# Altium footprint library MyPcbLib.PcbLib: 87 footprints (part 6 of 6)
Each footprint in its own frame and in the unit in brackets; x right, y up, seen from the top. Pads: shape width x height; smd on the part's side, far side on the other; paste and mask are expansions set on the pad; w line width, h text height; cw(c..) or ccw(c..) is an arc to the next point about the centre after c.
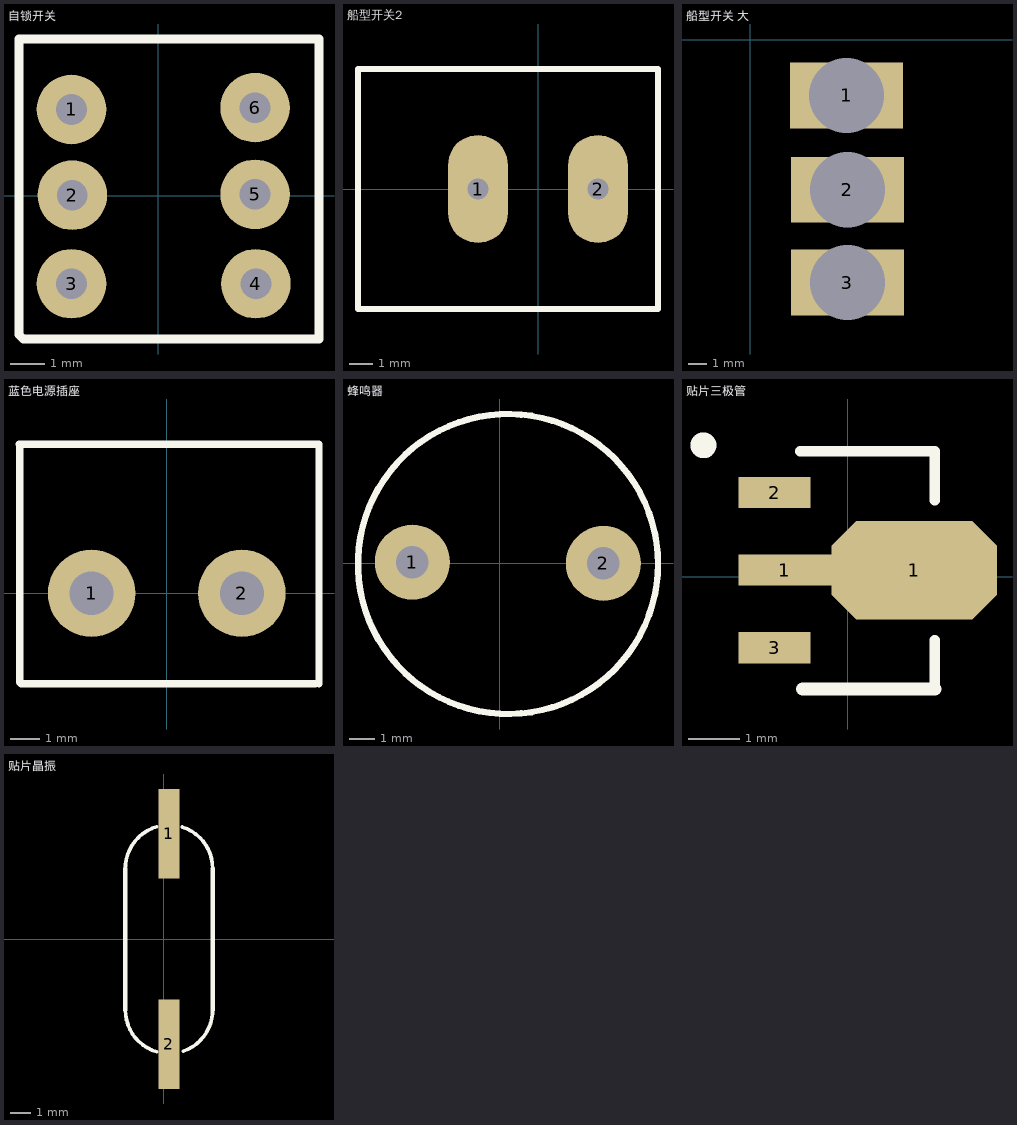
[diagram p5: the footprints below, top view; thin cyan lines are the x and y axes]

## 自锁开关 [mil]
pads (6):
  round 80 hole 35.33: 1(-99.62,98.93) 2(-98.6,0.38) 3(-99.62,-101.47) 4(112.47,-101.47) 5(111.45,1.4) 6(111.45,101.09)
Top Overlay:
  lines w10: -160,-160 -155,-165 185,-165 185,180 -160,180 -160,-160

## 船型开关2 [mil]
pads (2):
  oval 100x180 hole 35.33: 1(-100,0) 2(100,0)
Top Overlay:
  lines w10: -300,-200 200,-200 200,200 -300,200 -300,-200

## 船型开关 大 [mm]
pads (3):
  rect 6x3.5 hole 4: 1(5.105,-2.972) 2(5.156,-7.976) 3(5.156,-12.903)

## 蓝色电源插座 [mm]
pads (2):
  round 3 hole 1.5: 1(-2.578,0) 2(2.578,0)
Top Overlay:
  lines w0.254: -5.067,5.105 5.22,5.105 5.22,-3.099 ; -5.042,-3.048 -5.042,5.08 ; -4.991,-3.099 5.093,-3.099

## 蜂鸣器 [mm]
pads (2):
  round 3 hole 1.3: 1(-3.505,0.051) 2(4.14,0)
Top Overlay:
  circle w0.254: c0.325,-0.025 r6

## 贴片三极管 [mm] "SOT89"
height 2.54
pads (4):
  rect 1.8x0.6 smd: 1(-1.219,0.127)
  oct 3.2x1.9 smd: 1(1.281,0.127)
  rect 1.4x0.6 smd: 2(-1.419,1.627) 3(-1.419,-1.373)
Top Overlay:
  circle w0.25: c-2.792,2.54 r0.125
  lines w0.2: -0.919,2.427 1.681,2.427 1.681,1.477 ; 1.681,-2.173 1.681,-1.223
  lines w0.254: -0.875,-2.173 1.681,-2.173
Mechanical 15:
  lines w0.1: -0.119,0.127 0.881,0.127 ; 0.381,-0.373 0.381,0.627

## 贴片晶振 [mm]
pads (2):
  rect 1x4.3 smd: 1(0.254,5.08) 2(0.254,-5.055)
Top Overlay:
  lines w0.178: -1.846,-3.4 ccw(c0.254,-3.4) -0.339,-5.415 ; -1.845,3.346 cw(c0.254,3.4) -0.337,5.415 ; 0.895,5.4 cw(c0.254,3.4) 2.354,3.4 ; 0.937,-5.386 ccw(c0.254,-3.4) 2.352,-3.319
  lines w0.203: -1.846,-3.4 -1.846,3.4 ; 2.354,-3.4 2.354,3.4